# Altium footprint library 我的元件库01.PcbLib: 321 footprints (part 13 of 21)
Each footprint in its own frame and in the unit in brackets; x right, y up, seen from the top. Pads: shape width x height; smd on the part's side, far side on the other; paste and mask are expansions set on the pad; w line width, h text height; cw(c..) or ccw(c..) is an arc to the next point about the centre after c.
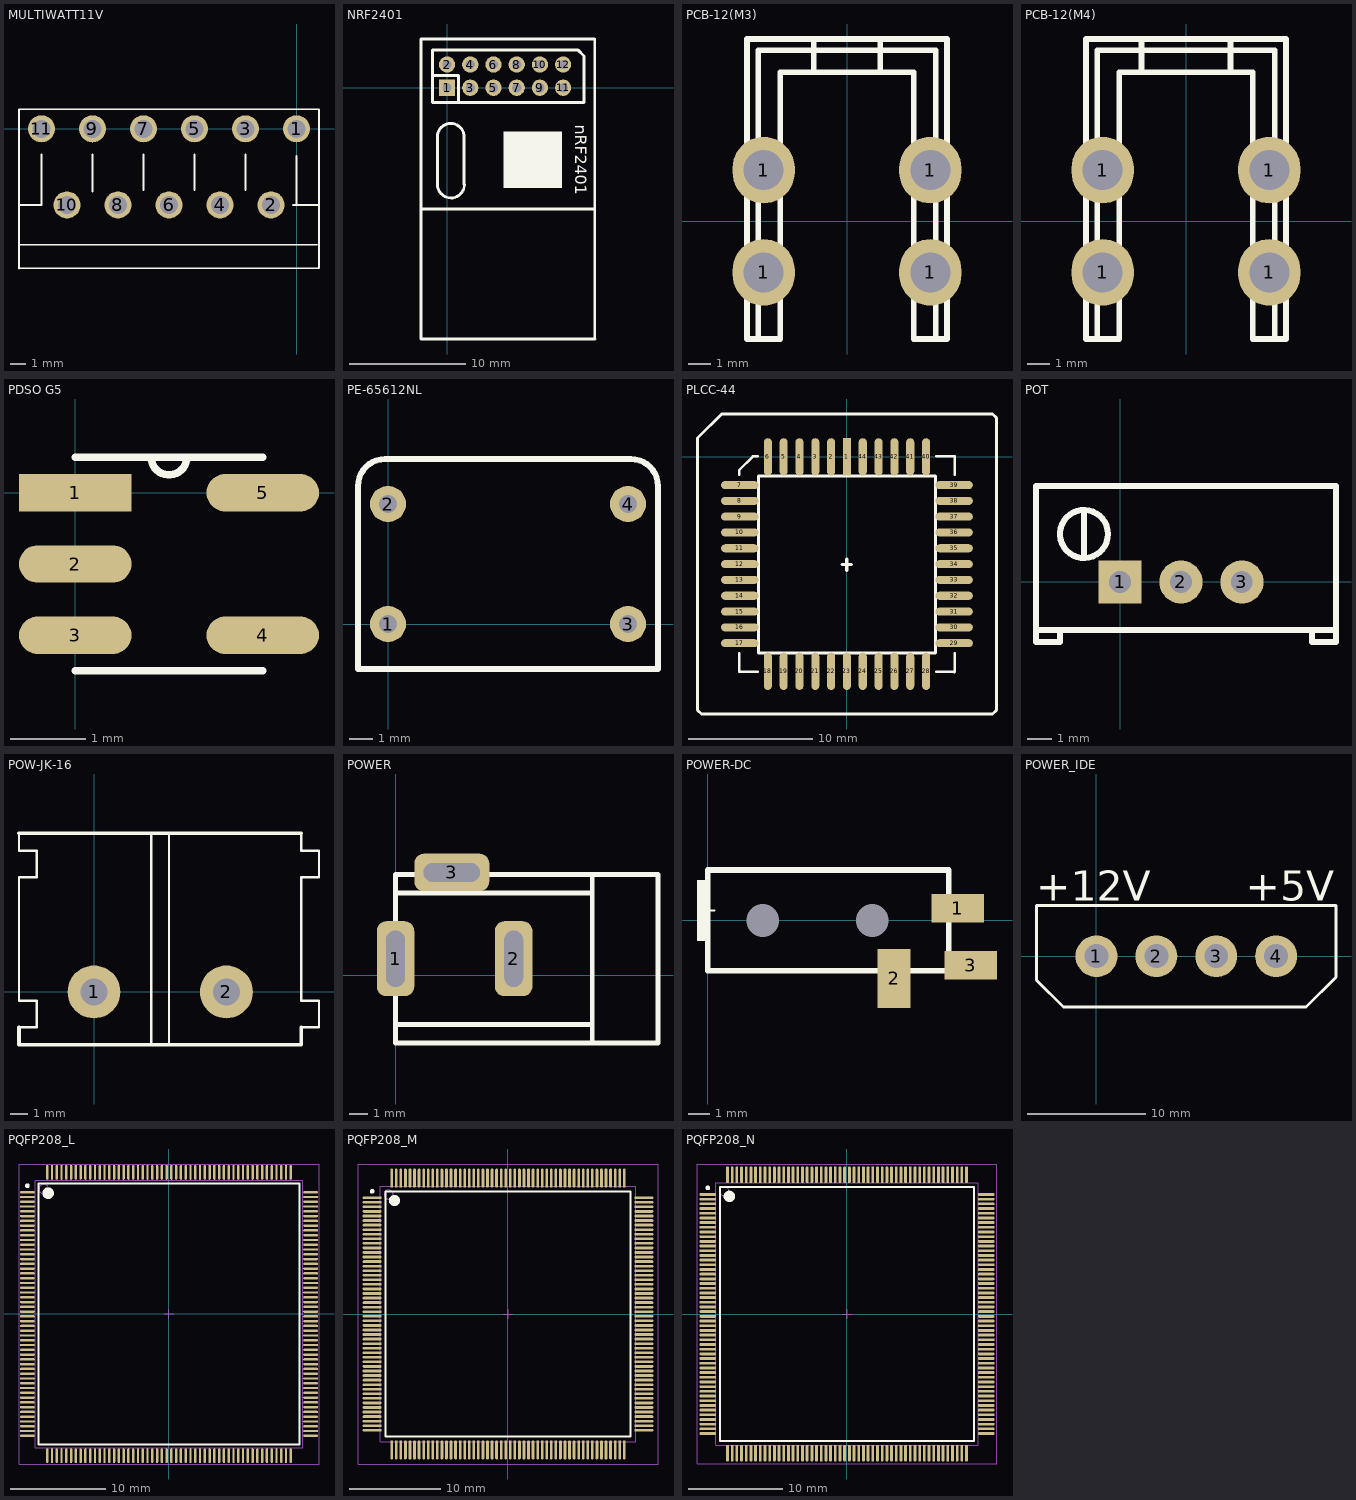
[diagram p12: the footprints below, top view; thin cyan lines are the x and y axes]

## MULTIWATT11V [mm]
pads (11):
  round 1.8 hole 1.2: 1(0,0) 2(-1.7,-5.08) 3(-3.4,0) 4(-5.1,-5.08) 5(-6.8,0) 6(-8.5,-5.08) 7(-10.2,0) 8(-11.9,-5.08) 9(-13.6,0) 10(-15.3,-5.08) 11(-17,0)
Top Overlay:
  lines w0.127: -18.432,-7.732 -17,-7.732 1.368,-7.732 ; -17,-1.7 -17,-5.08 -18.48,-5.08 -18.5,-5.1 ; -13.6,-4.2 -13.6,-1.7 ; -13.6,-0.86 -13.6,0 ; -10.2,-4.1 -10.2,-1.7 ; -10.2,-0.704 -10.2,0 ; -6.8,-4.1 -6.8,-1.7 ; -6.8,-0.468 -6.8,0 ; -3.4,-4.1 -3.4,-1.7 ; -3.4,-0.392 -3.4,0 ; -0.22,-5.08 1.48,-5.08 1.5,-5.1 ; 0,-5.08 0,-1.8 ; 0,-0.272 0,0 ; -18.5,-5.1 -18.5,-9.332 -18.468,-9.3 1.5,-9.3 1.5,-5.1 ; -18.5,-5.1 -18.5,1.3 1.5,1.3 1.5,-5.1
3D body "User Library-MULTIWAT T15.STEP": height 20.5, standoff -4.42, extent -18.461,-8.966 1.139,0.102

## NRF2401 [mm]
pads (12):
  rect 1.4x1.4 hole 0.8: 1(0,0)
  round 1.4 hole 0.8: 2(0,2) 3(2,0) 4(2,2) 5(4,0) 6(4,2) 7(6,0) 8(6,2) 9(8,0) 10(8,2) 11(10,0) 12(10,2)
Top Overlay:
  rectangle: 4.85,-8.625 9.9,-3.75
  lines w0.254: -2.25,-10.45 12.675,-10.45 12.725,-10.4 ; -1.27,1.045 0.995,1.045 0.995,-1.27 ; -0.843,-4.235 cw(c0.316,-4.239) 1.475,-4.25 1.475,-8.35 ; -0.825,-4.225 -0.825,-8.325 ccw(c0.334,-8.336) 1.493,-8.34 ; 11.25,3.27 11.255,3.27 ; 12.75,-21.65 12.725,-21.65 ; 11.255,3.27 -1.27,3.27 -1.27,-1.27 11.8,-1.27 11.8,2.725 11.255,3.27 ; 12.725,-21.65 12.725,4.175 12.7,4.2 -2.25,4.2 -2.25,-21.65 12.725,-21.65
  text "nRF2401" at 11.05,-3.175 h1.02

## PCB-12(M3) [mm]
pads (4):
  oval 2.8x3 hole 1.8: 1(-3.75,-2.3) 1(-3.75,2.3) 1(3.75,-2.3) 1(3.75,2.3)
Top Overlay:
  lines w0.254: -4,-5.3 -4,7.7 4,7.7 4,-5.3 ; -1.5,6.7 -1.5,8.2 ; 1.5,6.7 1.5,8.2 ; -4.5,-5.3 -3,-5.3 -3,6.7 3,6.7 3,-5.3 4.5,-5.3 4.5,8.2 -4.5,8.2 -4.5,-5.3
3D body "User Library-Terminal keystone 7700.STEP": height 8, standoff -5, extent -4.125,-3.48 4.125,7.82

## PCB-12(M4) [mm]
pads (4):
  oval 2.8x3 hole 1.8: 1(-3.75,-2.3) 1(-3.75,2.3) 1(3.75,-2.3) 1(3.75,2.3)
Top Overlay:
  lines w0.254: -4,-5.3 -4,7.7 4,7.7 4,-5.3 ; -2,6.7 -2,8.2 ; 2,6.7 2,8.2 ; -4.5,-5.3 -3,-5.3 -3,6.7 3,6.7 3,-5.3 4.5,-5.3 4.5,8.2 -4.5,8.2 -4.5,-5.3
3D body "User Library-Terminal keystone 7700.STEP": height 8, standoff -5, extent -4.1,-3.48 4.15,7.82

## PCBComponent_1 [mm]

## PDSO G5 [mm]
pads (5):
  rect 1.5x0.5 smd: 1(0,0)
  oval 1.5x0.5 smd: 2(0,-0.95) 3(0,-1.9) 4(2.5,-1.9) 5(2.5,0)
Top Overlay:
  lines w0.1: 0,-2.375 2.5,-2.375 ; 0,0.475 1.485,0.475 ; 1.012,0.475 ccw(c1.25,0.475) 1.488,0.475 ; 1.015,0.475 2.5,0.475

## PE-65612NL [mil]
pads (4):
  round 60 hole 30: 1(0,0) 2(0,200) 3(400,0) 4(400,200)
Top Overlay:
  lines w10: -50,-75 -50,230 cw(c-5,230) -5,275 405,275 cw(c405,230) 450,230 450,-75 -50,-75

## PLCC-44 [mm]
pads (44):
  rect 0.65x3 smd: 1(0,0)
  oval 0.65x3 smd: 2(-1.27,0) 3(-2.54,0) 4(-3.81,0) 5(-5.08,0) 6(-6.35,0) 18(-6.35,-17.216) 19(-5.08,-17.216) 20(-3.81,-17.216) 21(-2.54,-17.216) 22(-1.27,-17.216) 23(0,-17.216) 24(1.27,-17.216) 25(2.54,-17.216) 26(3.81,-17.216) 27(5.08,-17.216) 28(6.35,-17.216) 40(6.35,0) 41(5.08,0) 42(3.81,0) 43(2.54,0) 44(1.27,0)
  oval 3x0.65 smd: 7(-8.608,-2.258) 8(-8.608,-3.528) 9(-8.608,-4.798) 10(-8.608,-6.068) 11(-8.608,-7.338) 12(-8.608,-8.608) 13(-8.608,-9.878) 14(-8.608,-11.148) 15(-8.608,-12.418) 16(-8.608,-13.688) 17(-8.608,-14.958) 29(8.608,-14.958) 30(8.608,-13.688) 31(8.608,-12.418) 32(8.608,-11.148) 33(8.608,-9.878) 34(8.608,-8.608) 35(8.608,-7.338) 36(8.608,-6.068) 37(8.608,-4.798) 38(8.608,-3.528) 39(8.608,-2.258)
Top Overlay:
  lines w0.2: -8.65,-15.783 -8.65,-17.258 -7.175,-17.258 ; -8.65,-1.433 -8.65,-1.058 -7.55,0.042 -7.175,0.042 ; 7.175,-17.258 8.65,-17.258 8.65,-15.783 ; 7.175,0.042 8.65,0.042 8.65,-1.433
  lines w0.254: -0.375,-8.646 0.353,-8.646 ; -0.019,-9.121 -0.019,-8.206 ; 8.609,-17.258 8.65,-17.258 ; -11.995,-20.328 -11.679,-20.644 11.689,-20.644 12.005,-20.328 12.005,3.129 11.689,3.445 -10.066,3.445 -11.995,1.516 -11.995,0.5 -11.995,-20.328 ; -7.112,-15.752 -7.112,-1.528 7.112,-1.528 7.112,-15.752 -7.112,-15.752
3D body "plcc-44p.step": height 4.39, standoff 0, extent -8.788,-17.423 8.737,0.102

## POT [mm]
pads (3):
  rect 1.8x1.8 hole 0.9: 1(0,0)
  round 1.8 hole 0.9: 2(2.54,0) 3(5.08,0)
Top Overlay:
  circle w0.254: c-1.5,2 r1
  lines w0.254: -2.5,-2 -2.5,-2.5 -3.5,-2.5 -3.5,-2 ; -1.5,1 -1.5,3 ; 8,-2 8,-2.5 9,-2.5 9,-2 ; -3.5,-2 -3.5,4 9,4 9,-2 ; -3.5,-2 9,-2
3D body "SW3dPS-Potenciometro Vertical.STEP": height 12.46, standoff -5.04, extent -2.06,-2.438 7.14,2.362

## POW-JK-16 [mm]
pads (2):
  round 3 hole 1.524: 1(0,0) 2(7.5,0)
Top Overlay:
  lines w0.127: -4.25,-2 -3.25,-2 -3.25,-0.5 -4.25,-0.5 -4.25,6.5 -3.25,6.5 -3.25,8 -4.25,8 -4.25,9 ; 3.25,-3 3.25,9 ; 4.25,-3 4.25,9 ; 11.75,-2 12.75,-2 12.75,-0.5 11.75,-0.5 11.75,6.5 12.75,6.5 12.75,8 11.75,8 11.75,9
  lines w0.2: -4.25,-2 -4.25,-3 11.75,-3 11.75,-2 ; -4.25,9 11.75,9

## POWER [mm]
pads (3):
  rrect50% 2x4 hole 1 slot 3 at 90 deg: 1(0,0.889) 2(6.3,0.889)
  rrect50% 4x2 hole 1 slot 3 at 0 deg: 3(3,5.489)
Top Overlay:
  lines w0.254: 0,-2.616 10.49,-2.616 ; 0,4.394 10.49,4.394 ; 10.49,-3.607 10.49,5.385 ; 0,-3.607 0,5.385 13.995,5.385 13.995,-3.607 0,-3.607
3D body "User Library-dc range - dc connector[4840_2201].STEP": height 11.02, standoff -3.48, extent -0.043,-3.614 13.783,5.892

## POWER-DC [mm]
pads (5):
  round 0 hole 1.5 mask+0: 0(2.5,0) 0(7.5,0)
  rect 2.4x1.3 smd: 1(11.4,0.55) 3(12,-2.05)
  rect 1.5x2.7 smd: 2(8.5,-2.65)
Top Overlay:
  rectangle: -0.5,-0.95 0.1,1.85
  lines w0.1: -0.2,0.45 0.3,0.45
  lines w0.254: 0,-2.3 0,2.3 11,2.3 11,-2.3 0,-2.3
3D body "DC.STEP": height 4.4, standoff -0.8, extent 0.025,-3.875 12.625,2.425

## POWER_IDE [mil]
pads (4):
  round 140 hole 80: 1(0,0) 2(200,0) 3(400,0) 4(600,0)
Top Overlay:
  lines w10: 640,-170 700,-170 ; 800,-40 800,-70 ; 700,-170 -110,-170 -200,-80 -200,170 800,170 800,-70 ; 700,-170 800,-70
  text "+5V" at 498,185 h100
  text "+12V" at -202,185 h100
3D body "SW3dPS-Molex disk drive power connector.STEP": height 480, standoff 0, extent -158,-174 762,176

## PQFP208_L [mm] "Shrink QFP, 208-Leads, Body 28x28mm, Pitch 0.5mm, IPC High Density"
height 4.1
pads (208):
  oval 1.55x0.25 smd: 1(-14.825,12.75) 2(-14.825,12.25) 3(-14.825,11.75) 4(-14.825,11.25) 5(-14.825,10.75) 6(-14.825,10.25) 7(-14.825,9.75) 8(-14.825,9.25) 9(-14.825,8.75) 10(-14.825,8.25) 11(-14.825,7.75) 12(-14.825,7.25) 13(-14.825,6.75) 14(-14.825,6.25) 15(-14.825,5.75) 16(-14.825,5.25) 17(-14.825,4.75) 18(-14.825,4.25) 19(-14.825,3.75) 20(-14.825,3.25) 21(-14.825,2.75) 22(-14.825,2.25) 23(-14.825,1.75) 24(-14.825,1.25) 25(-14.825,0.75) 26(-14.825,0.25) 27(-14.825,-0.25) 28(-14.825,-0.75) 29(-14.825,-1.25) 30(-14.825,-1.75) 31(-14.825,-2.25) 32(-14.825,-2.75) 33(-14.825,-3.25) 34(-14.825,-3.75) 35(-14.825,-4.25) 36(-14.825,-4.75) 37(-14.825,-5.25) 38(-14.825,-5.75) 39(-14.825,-6.25) 40(-14.825,-6.75) 41(-14.825,-7.25) 42(-14.825,-7.75) 43(-14.825,-8.25) 44(-14.825,-8.75) 45(-14.825,-9.25) 46(-14.825,-9.75) 47(-14.825,-10.25) 48(-14.825,-10.75) 49(-14.825,-11.25) 50(-14.825,-11.75) 51(-14.825,-12.25) 52(-14.825,-12.75) 105(14.825,-12.75) 106(14.825,-12.25) 107(14.825,-11.75) 108(14.825,-11.25) 109(14.825,-10.75) 110(14.825,-10.25) 111(14.825,-9.75) 112(14.825,-9.25) 113(14.825,-8.75) 114(14.825,-8.25) 115(14.825,-7.75) 116(14.825,-7.25) 117(14.825,-6.75) 118(14.825,-6.25) 119(14.825,-5.75) 120(14.825,-5.25) 121(14.825,-4.75) 122(14.825,-4.25) 123(14.825,-3.75) 124(14.825,-3.25) 125(14.825,-2.75) 126(14.825,-2.25) 127(14.825,-1.75) 128(14.825,-1.25) 129(14.825,-0.75) 130(14.825,-0.25) 131(14.825,0.25) 132(14.825,0.75) 133(14.825,1.25) 134(14.825,1.75) 135(14.825,2.25) 136(14.825,2.75) 137(14.825,3.25) 138(14.825,3.75) 139(14.825,4.25) 140(14.825,4.75) 141(14.825,5.25) 142(14.825,5.75) 143(14.825,6.25) 144(14.825,6.75) 145(14.825,7.25) 146(14.825,7.75) 147(14.825,8.25) 148(14.825,8.75) 149(14.825,9.25) 150(14.825,9.75) 151(14.825,10.25) 152(14.825,10.75) 153(14.825,11.25) 154(14.825,11.75) 155(14.825,12.25) 156(14.825,12.75)
  oval 0.25x1.55 smd: 53(-12.75,-14.825) 54(-12.25,-14.825) 55(-11.75,-14.825) 56(-11.25,-14.825) 57(-10.75,-14.825) 58(-10.25,-14.825) 59(-9.75,-14.825) 60(-9.25,-14.825) 61(-8.75,-14.825) 62(-8.25,-14.825) 63(-7.75,-14.825) 64(-7.25,-14.825) 65(-6.75,-14.825) 66(-6.25,-14.825) 67(-5.75,-14.825) 68(-5.25,-14.825) 69(-4.75,-14.825) 70(-4.25,-14.825) 71(-3.75,-14.825) 72(-3.25,-14.825) 73(-2.75,-14.825) 74(-2.25,-14.825) 75(-1.75,-14.825) 76(-1.25,-14.825) 77(-0.75,-14.825) 78(-0.25,-14.825) 79(0.25,-14.825) 80(0.75,-14.825) 81(1.25,-14.825) 82(1.75,-14.825) 83(2.25,-14.825) 84(2.75,-14.825) 85(3.25,-14.825) 86(3.75,-14.825) 87(4.25,-14.825) 88(4.75,-14.825) 89(5.25,-14.825) 90(5.75,-14.825) 91(6.25,-14.825) 92(6.75,-14.825) 93(7.25,-14.825) 94(7.75,-14.825) 95(8.25,-14.825) 96(8.75,-14.825) 97(9.25,-14.825) 98(9.75,-14.825) 99(10.25,-14.825) 100(10.75,-14.825) 101(11.25,-14.825) 102(11.75,-14.825) 103(12.25,-14.825) 104(12.75,-14.825) 157(12.75,14.825) 158(12.25,14.825) 159(11.75,14.825) 160(11.25,14.825) 161(10.75,14.825) 162(10.25,14.825) 163(9.75,14.825) 164(9.25,14.825) 165(8.75,14.825) 166(8.25,14.825) 167(7.75,14.825) 168(7.25,14.825) 169(6.75,14.825) 170(6.25,14.825) 171(5.75,14.825) 172(5.25,14.825) 173(4.75,14.825) 174(4.25,14.825) 175(3.75,14.825) 176(3.25,14.825) 177(2.75,14.825) 178(2.25,14.825) 179(1.75,14.825) 180(1.25,14.825) 181(0.75,14.825) 182(0.25,14.825) 183(-0.25,14.825) 184(-0.75,14.825) 185(-1.25,14.825) 186(-1.75,14.825) 187(-2.25,14.825) 188(-2.75,14.825) 189(-3.25,14.825) 190(-3.75,14.825) 191(-4.25,14.825) 192(-4.75,14.825) 193(-5.25,14.825) 194(-5.75,14.825) 195(-6.25,14.825) 196(-6.75,14.825) 197(-7.25,14.825) 198(-7.75,14.825) 199(-8.25,14.825) 200(-8.75,14.825) 201(-9.25,14.825) 202(-9.75,14.825) 203(-10.25,14.825) 204(-10.75,14.825) 205(-11.25,14.825) 206(-11.75,14.825) 207(-12.25,14.825) 208(-12.75,14.825)
Top Overlay:
  circle w0.6: c-12.65,12.65 r0.3
  circle w0.25: c-14.825,13.425 r0.125
  lines w0.2: -13.65,-13.65 13.65,-13.65 13.65,13.65 -13.65,13.65 -13.65,-13.65
Mechanical 13:
  circle w0.1: c-13.1,13.1 r0.5
  lines w0.1: -14,-14 14,-14 14,14 -14,14 -14,-14
Mechanical 15:
  lines w0.1: -0.5,0 0.5,0 ; 0,-0.5 0,0.5 ; -15.7,-15.7 15.7,-15.7 15.7,15.7 -15.7,15.7 -15.7,-15.7
3D body "SW3dPS-TQFP-208-1.STEP": height 3.5, standoff 0, extent -15.318,-15.269 15.267,15.316

## PQFP208_M [mm] "Shrink QFP, 208-Leads, Body 28x28mm, Pitch 0.5mm, IPC Low Density"
height 4.1
pads (208):
  oval 2.1x0.3 smd: 1(-14.9,12.75) 2(-14.9,12.25) 3(-14.9,11.75) 4(-14.9,11.25) 5(-14.9,10.75) 6(-14.9,10.25) 7(-14.9,9.75) 8(-14.9,9.25) 9(-14.9,8.75) 10(-14.9,8.25) 11(-14.9,7.75) 12(-14.9,7.25) 13(-14.9,6.75) 14(-14.9,6.25) 15(-14.9,5.75) 16(-14.9,5.25) 17(-14.9,4.75) 18(-14.9,4.25) 19(-14.9,3.75) 20(-14.9,3.25) 21(-14.9,2.75) 22(-14.9,2.25) 23(-14.9,1.75) 24(-14.9,1.25) 25(-14.9,0.75) 26(-14.9,0.25) 27(-14.9,-0.25) 28(-14.9,-0.75) 29(-14.9,-1.25) 30(-14.9,-1.75) 31(-14.9,-2.25) 32(-14.9,-2.75) 33(-14.9,-3.25) 34(-14.9,-3.75) 35(-14.9,-4.25) 36(-14.9,-4.75) 37(-14.9,-5.25) 38(-14.9,-5.75) 39(-14.9,-6.25) 40(-14.9,-6.75) 41(-14.9,-7.25) 42(-14.9,-7.75) 43(-14.9,-8.25) 44(-14.9,-8.75) 45(-14.9,-9.25) 46(-14.9,-9.75) 47(-14.9,-10.25) 48(-14.9,-10.75) 49(-14.9,-11.25) 50(-14.9,-11.75) 51(-14.9,-12.25) 52(-14.9,-12.75) 105(14.9,-12.75) 106(14.9,-12.25) 107(14.9,-11.75) 108(14.9,-11.25) 109(14.9,-10.75) 110(14.9,-10.25) 111(14.9,-9.75) 112(14.9,-9.25) 113(14.9,-8.75) 114(14.9,-8.25) 115(14.9,-7.75) 116(14.9,-7.25) 117(14.9,-6.75) 118(14.9,-6.25) 119(14.9,-5.75) 120(14.9,-5.25) 121(14.9,-4.75) 122(14.9,-4.25) 123(14.9,-3.75) 124(14.9,-3.25) 125(14.9,-2.75) 126(14.9,-2.25) 127(14.9,-1.75) 128(14.9,-1.25) 129(14.9,-0.75) 130(14.9,-0.25) 131(14.9,0.25) 132(14.9,0.75) 133(14.9,1.25) 134(14.9,1.75) 135(14.9,2.25) 136(14.9,2.75) 137(14.9,3.25) 138(14.9,3.75) 139(14.9,4.25) 140(14.9,4.75) 141(14.9,5.25) 142(14.9,5.75) 143(14.9,6.25) 144(14.9,6.75) 145(14.9,7.25) 146(14.9,7.75) 147(14.9,8.25) 148(14.9,8.75) 149(14.9,9.25) 150(14.9,9.75) 151(14.9,10.25) 152(14.9,10.75) 153(14.9,11.25) 154(14.9,11.75) 155(14.9,12.25) 156(14.9,12.75)
  oval 0.3x2.1 smd: 53(-12.75,-14.9) 54(-12.25,-14.9) 55(-11.75,-14.9) 56(-11.25,-14.9) 57(-10.75,-14.9) 58(-10.25,-14.9) 59(-9.75,-14.9) 60(-9.25,-14.9) 61(-8.75,-14.9) 62(-8.25,-14.9) 63(-7.75,-14.9) 64(-7.25,-14.9) 65(-6.75,-14.9) 66(-6.25,-14.9) 67(-5.75,-14.9) 68(-5.25,-14.9) 69(-4.75,-14.9) 70(-4.25,-14.9) 71(-3.75,-14.9) 72(-3.25,-14.9) 73(-2.75,-14.9) 74(-2.25,-14.9) 75(-1.75,-14.9) 76(-1.25,-14.9) 77(-0.75,-14.9) 78(-0.25,-14.9) 79(0.25,-14.9) 80(0.75,-14.9) 81(1.25,-14.9) 82(1.75,-14.9) 83(2.25,-14.9) 84(2.75,-14.9) 85(3.25,-14.9) 86(3.75,-14.9) 87(4.25,-14.9) 88(4.75,-14.9) 89(5.25,-14.9) 90(5.75,-14.9) 91(6.25,-14.9) 92(6.75,-14.9) 93(7.25,-14.9) 94(7.75,-14.9) 95(8.25,-14.9) 96(8.75,-14.9) 97(9.25,-14.9) 98(9.75,-14.9) 99(10.25,-14.9) 100(10.75,-14.9) 101(11.25,-14.9) 102(11.75,-14.9) 103(12.25,-14.9) 104(12.75,-14.9) 157(12.75,14.9) 158(12.25,14.9) 159(11.75,14.9) 160(11.25,14.9) 161(10.75,14.9) 162(10.25,14.9) 163(9.75,14.9) 164(9.25,14.9) 165(8.75,14.9) 166(8.25,14.9) 167(7.75,14.9) 168(7.25,14.9) 169(6.75,14.9) 170(6.25,14.9) 171(5.75,14.9) 172(5.25,14.9) 173(4.75,14.9) 174(4.25,14.9) 175(3.75,14.9) 176(3.25,14.9) 177(2.75,14.9) 178(2.25,14.9) 179(1.75,14.9) 180(1.25,14.9) 181(0.75,14.9) 182(0.25,14.9) 183(-0.25,14.9) 184(-0.75,14.9) 185(-1.25,14.9) 186(-1.75,14.9) 187(-2.25,14.9) 188(-2.75,14.9) 189(-3.25,14.9) 190(-3.75,14.9) 191(-4.25,14.9) 192(-4.75,14.9) 193(-5.25,14.9) 194(-5.75,14.9) 195(-6.25,14.9) 196(-6.75,14.9) 197(-7.25,14.9) 198(-7.75,14.9) 199(-8.25,14.9) 200(-8.75,14.9) 201(-9.25,14.9) 202(-9.75,14.9) 203(-10.25,14.9) 204(-10.75,14.9) 205(-11.25,14.9) 206(-11.75,14.9) 207(-12.25,14.9) 208(-12.75,14.9)
Top Overlay:
  circle w0.25: c-14.9,13.45 r0.125
  circle w0.6: c-12.45,12.45 r0.3
  lines w0.2: -13.45,-13.45 -13.45,13.45 13.45,13.45 13.45,-13.45 -13.45,-13.45
Mechanical 13:
  circle w0.1: c-13.1,13.1 r0.5
  lines w0.1: -14,-14 -14,14 14,14 14,-14 -14,-14
Mechanical 15:
  lines w0.1: -0.5,0 0.5,0 ; 0,-0.5 0,0.5 ; -16.45,-16.45 -16.45,16.45 16.45,16.45 16.45,-16.45 -16.45,-16.45
3D body "SW3dPS-TQFP-208-1.STEP": height 3.5, standoff 0, extent -15.32,-15.318 15.265,15.267

## PQFP208_N [mm] "Shrink QFP, 208-Leads, Body 28x28mm, Pitch 0.5mm, IPC Medium Density"
height 4.1
pads (208):
  oval 1.8x0.3 smd: 1(-14.85,12.75) 2(-14.85,12.25) 3(-14.85,11.75) 4(-14.85,11.25) 5(-14.85,10.75) 6(-14.85,10.25) 7(-14.85,9.75) 8(-14.85,9.25) 9(-14.85,8.75) 10(-14.85,8.25) 11(-14.85,7.75) 12(-14.85,7.25) 13(-14.85,6.75) 14(-14.85,6.25) 15(-14.85,5.75) 16(-14.85,5.25) 17(-14.85,4.75) 18(-14.85,4.25) 19(-14.85,3.75) 20(-14.85,3.25) 21(-14.85,2.75) 22(-14.85,2.25) 23(-14.85,1.75) 24(-14.85,1.25) 25(-14.85,0.75) 26(-14.85,0.25) 27(-14.85,-0.25) 28(-14.85,-0.75) 29(-14.85,-1.25) 30(-14.85,-1.75) 31(-14.85,-2.25) 32(-14.85,-2.75) 33(-14.85,-3.25) 34(-14.85,-3.75) 35(-14.85,-4.25) 36(-14.85,-4.75) 37(-14.85,-5.25) 38(-14.85,-5.75) 39(-14.85,-6.25) 40(-14.85,-6.75) 41(-14.85,-7.25) 42(-14.85,-7.75) 43(-14.85,-8.25) 44(-14.85,-8.75) 45(-14.85,-9.25) 46(-14.85,-9.75) 47(-14.85,-10.25) 48(-14.85,-10.75) 49(-14.85,-11.25) 50(-14.85,-11.75) 51(-14.85,-12.25) 52(-14.85,-12.75) 105(14.85,-12.75) 106(14.85,-12.25) 107(14.85,-11.75) 108(14.85,-11.25) 109(14.85,-10.75) 110(14.85,-10.25) 111(14.85,-9.75) 112(14.85,-9.25) 113(14.85,-8.75) 114(14.85,-8.25) 115(14.85,-7.75) 116(14.85,-7.25) 117(14.85,-6.75) 118(14.85,-6.25) 119(14.85,-5.75) 120(14.85,-5.25) 121(14.85,-4.75) 122(14.85,-4.25) 123(14.85,-3.75) 124(14.85,-3.25) 125(14.85,-2.75) 126(14.85,-2.25) 127(14.85,-1.75) 128(14.85,-1.25) 129(14.85,-0.75) 130(14.85,-0.25) 131(14.85,0.25) 132(14.85,0.75) 133(14.85,1.25) 134(14.85,1.75) 135(14.85,2.25) 136(14.85,2.75) 137(14.85,3.25) 138(14.85,3.75) 139(14.85,4.25) 140(14.85,4.75) 141(14.85,5.25) 142(14.85,5.75) 143(14.85,6.25) 144(14.85,6.75) 145(14.85,7.25) 146(14.85,7.75) 147(14.85,8.25) 148(14.85,8.75) 149(14.85,9.25) 150(14.85,9.75) 151(14.85,10.25) 152(14.85,10.75) 153(14.85,11.25) 154(14.85,11.75) 155(14.85,12.25) 156(14.85,12.75)
  oval 0.3x1.8 smd: 53(-12.75,-14.85) 54(-12.25,-14.85) 55(-11.75,-14.85) 56(-11.25,-14.85) 57(-10.75,-14.85) 58(-10.25,-14.85) 59(-9.75,-14.85) 60(-9.25,-14.85) 61(-8.75,-14.85) 62(-8.25,-14.85) 63(-7.75,-14.85) 64(-7.25,-14.85) 65(-6.75,-14.85) 66(-6.25,-14.85) 67(-5.75,-14.85) 68(-5.25,-14.85) 69(-4.75,-14.85) 70(-4.25,-14.85) 71(-3.75,-14.85) 72(-3.25,-14.85) 73(-2.75,-14.85) 74(-2.25,-14.85) 75(-1.75,-14.85) 76(-1.25,-14.85) 77(-0.75,-14.85) 78(-0.25,-14.85) 79(0.25,-14.85) 80(0.75,-14.85) 81(1.25,-14.85) 82(1.75,-14.85) 83(2.25,-14.85) 84(2.75,-14.85) 85(3.25,-14.85) 86(3.75,-14.85) 87(4.25,-14.85) 88(4.75,-14.85) 89(5.25,-14.85) 90(5.75,-14.85) 91(6.25,-14.85) 92(6.75,-14.85) 93(7.25,-14.85) 94(7.75,-14.85) 95(8.25,-14.85) 96(8.75,-14.85) 97(9.25,-14.85) 98(9.75,-14.85) 99(10.25,-14.85) 100(10.75,-14.85) 101(11.25,-14.85) 102(11.75,-14.85) 103(12.25,-14.85) 104(12.75,-14.85) 157(12.75,14.85) 158(12.25,14.85) 159(11.75,14.85) 160(11.25,14.85) 161(10.75,14.85) 162(10.25,14.85) 163(9.75,14.85) 164(9.25,14.85) 165(8.75,14.85) 166(8.25,14.85) 167(7.75,14.85) 168(7.25,14.85) 169(6.75,14.85) 170(6.25,14.85) 171(5.75,14.85) 172(5.25,14.85) 173(4.75,14.85) 174(4.25,14.85) 175(3.75,14.85) 176(3.25,14.85) 177(2.75,14.85) 178(2.25,14.85) 179(1.75,14.85) 180(1.25,14.85) 181(0.75,14.85) 182(0.25,14.85) 183(-0.25,14.85) 184(-0.75,14.85) 185(-1.25,14.85) 186(-1.75,14.85) 187(-2.25,14.85) 188(-2.75,14.85) 189(-3.25,14.85) 190(-3.75,14.85) 191(-4.25,14.85) 192(-4.75,14.85) 193(-5.25,14.85) 194(-5.75,14.85) 195(-6.25,14.85) 196(-6.75,14.85) 197(-7.25,14.85) 198(-7.75,14.85) 199(-8.25,14.85) 200(-8.75,14.85) 201(-9.25,14.85) 202(-9.75,14.85) 203(-10.25,14.85) 204(-10.75,14.85) 205(-11.25,14.85) 206(-11.75,14.85) 207(-12.25,14.85) 208(-12.75,14.85)
Top Overlay:
  circle w0.6: c-12.55,12.55 r0.3
  circle w0.25: c-14.85,13.45 r0.125
  lines w0.2: -13.55,-13.55 13.55,-13.55 13.55,13.55 -13.55,13.55 -13.55,-13.55
Mechanical 13:
  circle w0.1: c-13.1,13.1 r0.5
  lines w0.1: -14,-14 14,-14 14,14 -14,14 -14,-14
Mechanical 15:
  lines w0.1: -0.5,0 0.5,0 ; 0,-0.5 0,0.5 ; -16,-16 16,-16 16,16 -16,16 -16,-16
3D body "SW3dPS-TQFP-208-1.STEP": height 3.5, standoff 0, extent -15.269,-15.32 15.316,15.265